# Altium integrated library Lib_MS_V4.0.IntLib: 296 symbols (part 1 of 2) (continued)
## Cap Cer_470pF_50V_X7R_0603 (continued)
CAP CER 470PF 50V X7R 0603; ComponentLink1Description: LKCL; ComponentLink1URL: https://linhkienchatluong.vn/tu-dan-0603/tu-dan-0603-471-470pf-047nf-50v-10-10c_sp1063_ct14367.aspx; ComponentLink2Description: DIGIKEY; ComponentLink2URL: https://www.digikey.com/en/products/detail/vishay-vitramon/VJ0603Y471KXACW1BC/420860?s=N4IgTCBcDaIAwDY4GYBCAWA7ARgNIFY44A5AFRAF0BfIA
footprint Cap_0603
pins: 1, 2

## Cap Cer_1800pF_50V_X7R_0603
designator C?, comment value 1800pF  Package: 0603  Voltage: 50V  (hidden comment: C0603C182K5RACTU)
1800 pF ±10% 50V Ceramic Capacitor X7R 0603 (1608 Metric); ComponentLink1Description: CXT; ComponentLink2Description: DIGIKEY; ComponentLink2URL: https://www.digikey.bg/en/products/detail/kemet/C0603C182K5RACTU/2200109
footprint Cap_0603
pins: 1, 2

## Cap Cer_2200pF_50V_X7R_0402
designator C?, comment value 2200pF  Package: 0402  Voltage: 50V  (hidden comment: GRM155R71H222KA01D)
CAP CER 2200PF 50V X7R 0402; ComponentLink1Description: CXT; ComponentLink1URL: https://linhkien.cxtvn.com/8769-tu-khong-phan-cuc-0402.html; ComponentLink2Description: DIGIKEY; ComponentLink2URL: https://www.digikey.bg/en/products/detail/murata-electronics/GRM155R71H222KA01D/587234?s=N4IgTCBcDaIOICUCyBGArGhB2FAJMBA0gIIAMKAIiALoC%2BQA
footprint Cap_0402
pins: 1, 2

## Cap Cer_3300pF_25V_X7R_0603
designator C?, comment value 3300pF  Package: 0603  Voltage: 25V  (hidden comment: KGM15AR71E332KT)
3300 pF ±10% 25V Ceramic Capacitor X7R 0603 (1608 Metric); ComponentLink2Description: DIGIKEY; ComponentLink2URL: https://www.digikey.bg/en/products/detail/kyocera-avx/KGM15AR71E332KT/1599455
footprint Cap_0603
pins: 1, 2

## Cap Cer_5600pF_50V_X7R_0603
designator C?, comment value 5600pF  Package: 0603  Voltage: 50V  (hidden comment: CL10B562KB8NNNC)
5600 pF ±10% 50V Ceramic Capacitor X7R 0603 (1608 Metric); ComponentLink1Description: CXT; ComponentLink2Description: DIGIKEY; ComponentLink2URL: https://www.digikey.bg/en/products/detail/samsung-electro-mechanics/CL10B562KB8NNNC/3887749
footprint Cap_0603
pins: 1, 2

## Cap tantalum_47uF_10V_3216
designator C?, comment 47uF  Package: 3216  Voltage: 10V
Cap tantalum 476A - 47uF 10V SMD3216; ComponentLink1Description: BLK; ComponentLink1URL: https://banlinhkien.com/tu-tantalum-476a47uf-10v-smd3216-p6650490.html; Value: 47uF
footprint Cap tantalum_3216
pins: 1, 2

## CON 2 15EDG3.81-2P Xanh Cong
designator J?, comment 284513-2  (value not drawn)
Terminal Block THT Right Angle 2-Position Header 3.81mm pitch; Manufacturer 1: Tyco Electronics; Pitch: 0.150" (3.81mm); Voltage: 300V; Category: Connectors; Mounting Type: Through Hole; Package / Case: Side Entry; 3.81mm pitch; Manufacturer Part Number 1: 284513-2; ComponentLink1Description: New link; ComponentLink1URL: https://banlinhkien.com/con-2-15edg3.812p-xanh-cong-p6649884.html
footprint CON 2 15EDG3.81-2P
pins: 1, 2

## CON 2 KF7.62-2P 7.62MM
designator J?  (value not drawn)
Current: 20A; Voltage: 300V; ComponentLink1Description: BLK; ComponentLink1URL: https://banlinhkien.com/con-2-kf7.622p-7.62mm-den-thang-p6649864.html; Size: 7.62mm; ComponentLink2Description: CXT; ComponentLink2URL: https://linhkien.cxtvn.com/8859-cau-dau-kf762-762mm.html
footprint CON 2 KF7.62-2P 7.62MM
pins: 1, 2

## CON 4 15EDG3.81-4P Xanh Cong
designator J?, comment 284513-4  (value not drawn)
Terminal Block THT Right Angle 4-Position Header 3.81mm pitch; Pitch: 0.150" (3.81mm); Voltage: 300V; Value: 4 position; Category: Connectors; Mounting Type: Through Hole; Terminal Block Type: Header, Male Pins, Right-angle, Shrouded (4 Side); Package / Case: Side Entry; 3.81mm pitch; Manufacturer Part Number 1: 284513-4; ComponentLink1Description: New link; ComponentLink1URL: https://banlinhkien.com/con-4-15edg3.814p-xanh-cong-p12117346.html
footprint CON 4 15EDG3.81-4P (TERM BLOCK HDR 4POS 3.81MM RIGHT-ANGLE)
pins: 1, 2, 3, 4

## CON 5 15EDG3.81-5P Xanh Cong
designator J?, comment 284513-5  (value not drawn)
Terminal Block THT Right Angle 5-Position Header 3.81mm pitch; Pitch: 0.150" (3.81mm); Voltage: 300V; Value: 5 position; Positions Per Level: 6; Category: Connectors; Mounting Type: Through Hole; Terminal Block Type: Header, Male Pins, Right-angle, Shrouded (4 Side); Package / Case: Side Entry; 3.81mm pitch; Manufacturer Part Number 1: 284513-5; ComponentLink1Description: New link; ComponentLink1URL: https://banlinhkien.com/con-4-15edg3.814p-xanh-cong-p12117346.html
footprint CON 5 15EDG3.81-5P (TERM BLOCK HDR 5POS 3.81MM RIGHT-ANGLE)
pins: 1, 2, 3, 4, 5

## CON 6 15EDG3.81-6P Xanh Cong
designator J?, comment 284513-6  (value not drawn)
Terminal Block THT Right Angle 6-Position Header 3.81mm pitch; Pitch: 0.150" (3.81mm); Voltage: 300V; Value: 6 position; Positions Per Level: 6; Category: Connectors; Mounting Type: Through Hole; Terminal Block Type: Header, Male Pins, Right-angle, Shrouded (4 Side); Package / Case: Side Entry; 3.81mm pitch; Manufacturer Part Number 1: 284513-6; ComponentLink1Description: Link_Digikey; ComponentLink1URL: https://www.digikey.com/en/products/detail/te-connectivity-amp-connectors/284513-6/1150189; ComponentLink2Description: CXT; ComponentLink2URL: https://linhkien.cxtvn.com/9006-cau-dau-15edg381-381mm-xanh-cong-mau-nhat.html
footprint CON 6 15EDG3.81-6P
pins: 1, 2, 3, 4, 5, 6 2

## CON 9 15EDG3.81-9P Xanh Cong
designator J?, comment 284513-9  (value not drawn)
Terminal Block THT Right Angle 9-Position Header 3.81mm pitch; Pitch: 0.150" (3.81mm); Voltage: 300V; Value: 9 position; Category: Connectors; Mounting Type: Through Hole; Terminal Block Type: Header, Male Pins, Right-angle, Shrouded (4 Side); Package / Case: Side Entry; 3.81mm pitch; Manufacturer Part Number 1: 284513-9; ComponentLink1Description: DIGIKEY; ComponentLink1URL: https://www.digikey.bg/en/products/detail/te-connectivity-amp-connectors/284513-9/1827406?s=N4IgTCBcDa4BwBYCsBGAzAWgJwgLoF8g; ComponentLink2Description: BLK; ComponentLink2URL: https://banlinhkien.com/con-9-15edg3.819p-xanh-cong-p12118760.html
footprint CON 9 15EDG3.81-9P
pins: 1, 2, 3, 4, 5, 6 2, 7 3, 8 4, 9 5

## CON_7798
designator J?, comment 7798
6 Pin Screw Terminal, Power Tap M4 Through Hole; Manufacturer: Keystone Electronics; Number Pin: 6; Description SEL: TERM SCREW M4 6 PIN PCB; Current Rating (Amps): 30A; Part Number: 7798; ComponentLink1Description: New link; ComponentLink1URL: https://www.digikey.com/en/products/detail/keystone-electronics/7798/2171014
footprint 7798
pins: 1, 2, 3, 4, 5, 6

## CON_XHB 2.5-6A
designator H?, comment XHB 2.5-6A
Manufacturer: Molex; Description SEL: Header 6P 2.5 chân thẳng có khóa; Part Number: XHB 2.5-6A; Footprint Type: TH; ComponentLink1Description: TGIC; ComponentLink1URL: https://www.thegioiic.com/dau-xhb-6a-2-54mm-6-chan-thang-xuyen-lo
footprint XHB-6A
pins: 1, 2, 3, 4, 5, 6

## CONN_HB9500_8P_9.5mm
designator CONN?, comment HB9500-8P
HB9500-8P 9.5mm; Part Number: HB9500; Voltage: 300V; Current: 30A; Number Pin: 8; Pitch: 9.5mm; ComponentLink1Description: LKCL; ComponentLink1URL: https://linhkienchatluong.vn/cau-dau-hb9500-co-nap/cau-dau-8p-hb9500-8p-95mm-co-nap-bao-ve_sp997_ct9544.aspx
footprint CONN_HB9500_9.5mm
pins: 1, 2, 3, 4, 5, 6, 7, 8

## CONN_JST_1.25mm_Vertical
designator CONN?
Position: 7; Pitch: 1.25mm; ComponentLink1Description: Aliexpress; ComponentLink1URL: https://vi.aliexpress.com/item/4000691087661.html?gatewayAdapt=glo2vnm; Category: Connector
footprint CONN_JST_1.25mm_7P
pins: 1, 2, 3, 4, 5, 6, 7

## CONN_SMA-J-P-H-ST-EM1
designator J?, comment SMA-J-P-H-ST-EM1
SMA Connector Jack, Female Socket 50 Ohms Board Edge, End Launch Solder; Manufacturer: SAMTEC; Impedance: 50 Ohms; Frequency - Max: 20 GHz; Manufacturer_Part_Number: SMA-J-P-H-ST-EM1; ComponentLink1Description: CXT; ComponentLink1URL: https://linhkien.cxtvn.com/1140-de-anten-sma-khd-cai-16mm-5-chan-thang-cao-135mm.html; ComponentLink2Description: DIGIKEY; ComponentLink2URL: https://www.digikey.com/en/products/detail/samtec-inc/SMA-J-P-H-ST-EM1/2602450
footprint CO_SAMTEC_SMA-J-P-ST-EMI
pins: 1 X, 2 Y

## DB9_Female
designator J?, comment LK_01108  (value not drawn)
Connector, DB9 R/A Through-hole Female; Number Pin: 9; ComponentLink1Description: BLK; ComponentLink1URL: https://banlinhkien.com/db9-cai-cong-p6653347.html; Sort: Female
footprint DB9_Female
pins: 1, 2, 3, 4, 5, 6, 7, 8, 9, 10 MH1, 11 MH2

## DB9_Male
designator J?, comment LK_01111  (value not drawn)
Connector, DB9 R/A Through-hole Male; Number Pin: 9; ComponentLink1Description: New link; ComponentLink1URL: https://banlinhkien.com/db9-duc-cong-p6653350.html; Sort: Male
footprint DB9
pins: 1, 2, 3, 4, 5, 6, 7, 8, 9, 10 MH1, 11 MH2

## Diode-Bridge_KBP307
designator DB?, comment KBP307
Cắm; Manufacturer: EVVO; Voltage: 700V; Current: 3A; Voltage - Forward: 1.1 V; Part Number: KBP307; Package: 4-SIP, KBP; ComponentLink1Description: BLK; ComponentLink1URL: https://banlinhkien.com/diode-cau-3a-700v-kbp307-vuong-p6653424.html; ComponentLink2Description: DIGIKEY; ComponentLink2URL: https://www.digikey.bg/en/products/detail/evvo/KBP307/26582989
footprint DIODE-BRIDGE_KBP307
pins: 1 +, 2 ~, 3 ~, 4 -

## Diode-ESD_ESD9B5.0ST5G
designator D?, comment Capacitance: 15pF  Voltage - Reverse: 5V  (hidden comment: ESD9B5.0ST5G)
TVS DIODE 5VWM SOD923; Voltage - Breakdown: 5.8; Sort: Bidirectional; ComponentLink1Description: New link; ComponentLink1URL: https://www.digikey.bg/en/products/detail/onsemi/ESD9B5-0ST5G/1646449; Package: SOD-923
footprint Diode_ESD_ESD9B5.0ST5G
pins: 1 A, 2 A1

## Diode-Schottky_1N4007
designator D?, comment 1N4007  Sort: Schottky  Current: 1A  Voltage: 1000V
DIODE SCHOTTKY 1000V 1A SOD123; Mouting type: SMD; ComponentLink1Description: BLK; ComponentLink1URL: https://banlinhkien.com/diode-t7-sod123-1n4007-sod123-10c-p16398844.html; Package: SOD-123; MSL: 1; ComponentLink2Description: DIGIKEY; ComponentLink2URL: https://www.digikey.bg/en/products/detail/smc-diode-solutions/1N4007FL/11657817
footprint DIODE_SCHOTTKY_SS14(1N5819)
pins: 1 A, 2 K

## Diode-Schottky_1N5819HW-7-F
designator D?, comment 1N5819HW-7-F  Sort: Schottky  Current: 1A  Voltage: 40V
Diode 40 V 1A Surface Mount SOD-123; Mouting type: SMD; ComponentLink1Description: BLK; ComponentLink1URL: https://banlinhkien.com/diode-s4-sod123-1n5819-sod123-10c-p16133952.html; Package: SOD-123; MSL: 1; ComponentLink2Description: DIGIKEY; ComponentLink2URL: https://www.digikey.com/en/products/detail/diodes-incorporated/1N5819HW-7-F/814970
footprint DIODE_SCHOTTKY_SS14(1N5819)
pins: 1 A, 2 K

## Diode-Schottky_BAS100CS-AU_R1_000A1
designator D?, comment BAS100CS-AU_R1_000A1  Sort: Schottky  Current: 500mA  Voltage: 100V
Diode 100 V 500mA Surface Mount SOD-323; Manufacturer: Panjit International Inc.; Description SEL: DIODE SCHOTTKY 100V 500MA SOD323; Part Number: BAS100CS-AU_R1_000A1; Footprint Type: SMD; ComponentLink1Description: DIGIKEY; ComponentLink1URL: https://www.digikey.com/en/products/detail/panjit-international-inc/BAS100CS-AU-R1-000A1/14660870; Package: SOD-123
footprint DIODE-SCHOTTKY_BAS100CS-AU_R1_000A1_SOD323
pins: 1 A, 2 K

## Diode-Schottky_BAT42WS-7-F
designator D?, comment BAT42WS-7-F  Sort: Schottky  Voltage: 30V  Current: 200mA
DIODE SCHOTTKY 30V 200MA SOD323; Manufacturer: Diodes Inc.; Part Number: BAT42WS-7-F; Footprint Type: SMD; Packaging: SOD-323; ComponentLink1Description: DIGIKEY; ComponentLink1URL: https://www.digikey.com/en/products/detail/diodes-incorporated/BAT42WS-7-F/806536
footprint DIODE_SCHOTTKY_BAT42WS-7-F
pins: 1 A, 2 K

## Diode-Schottky_BAT46W-7-F
designator D?, comment BAT46W-7-F  Sort: Schottky  Current: 150mA  Voltage: 100V
Diode 100 V 150mA Surface Mount SOD-123; Manufacturer: Diodes Incorporated; Part Number: BAT46W-7-F; Footprint Type: SMD; ComponentLink1Description: DIGIKEY; ComponentLink1URL: https://www.digikey.bg/en/products/detail/diodes-incorporated/BAT46W-7-F/1934440; Package: SOD123
footprint DIODE-SCHOTTKY_BAT46W-7-F
pins: 1 A, 2 K

## Diode-Schottky_CDBM1100-G
designator D?, comment CDBM1100-G  Sort: Schottky  Current: 1A  Voltage: 100V
DIODE SCHOTTK 100V 1A MINI SMA; Manufacturer: Comchip Technology; Description SEL: DIODE SCHOTTKY 100V 1A MINISMA; Part Number: CDBM1100-G; ComponentLink1Description: DIGIKEY; ComponentLink1URL: https://www.digikey.com/en/products/detail/comchip-technology/CDBM1100-G/2021250?s=N4IgTCBcDaIMIBEBCBZAjGgDJgtAcRAF0BfIA; Package: SOD-123
footprint DIODE-SCHOTTKY_CDBM1100-G
pins: 1 A, 2 K

## Diode-Schottky_SBA340AL_R1_00001
designator D?, comment Sort: Schottky  Current: 3A  Voltage: 40V  (hidden comment: SBA340AL_R1_00001)
DIODE SCHOTTKY 40V 3A SOD123FL; ComponentLink1Description: New link; ComponentLink1URL: https://www.digikey.bg/en/products/detail/panjit-international-inc/SBA340AL-R1-00001/14660768; Part Number: SBA340AL_R1_00001; Package: SOD-123FL
footprint Diode_Schottky_SOD-123FL
pins: 1 A, 2 K

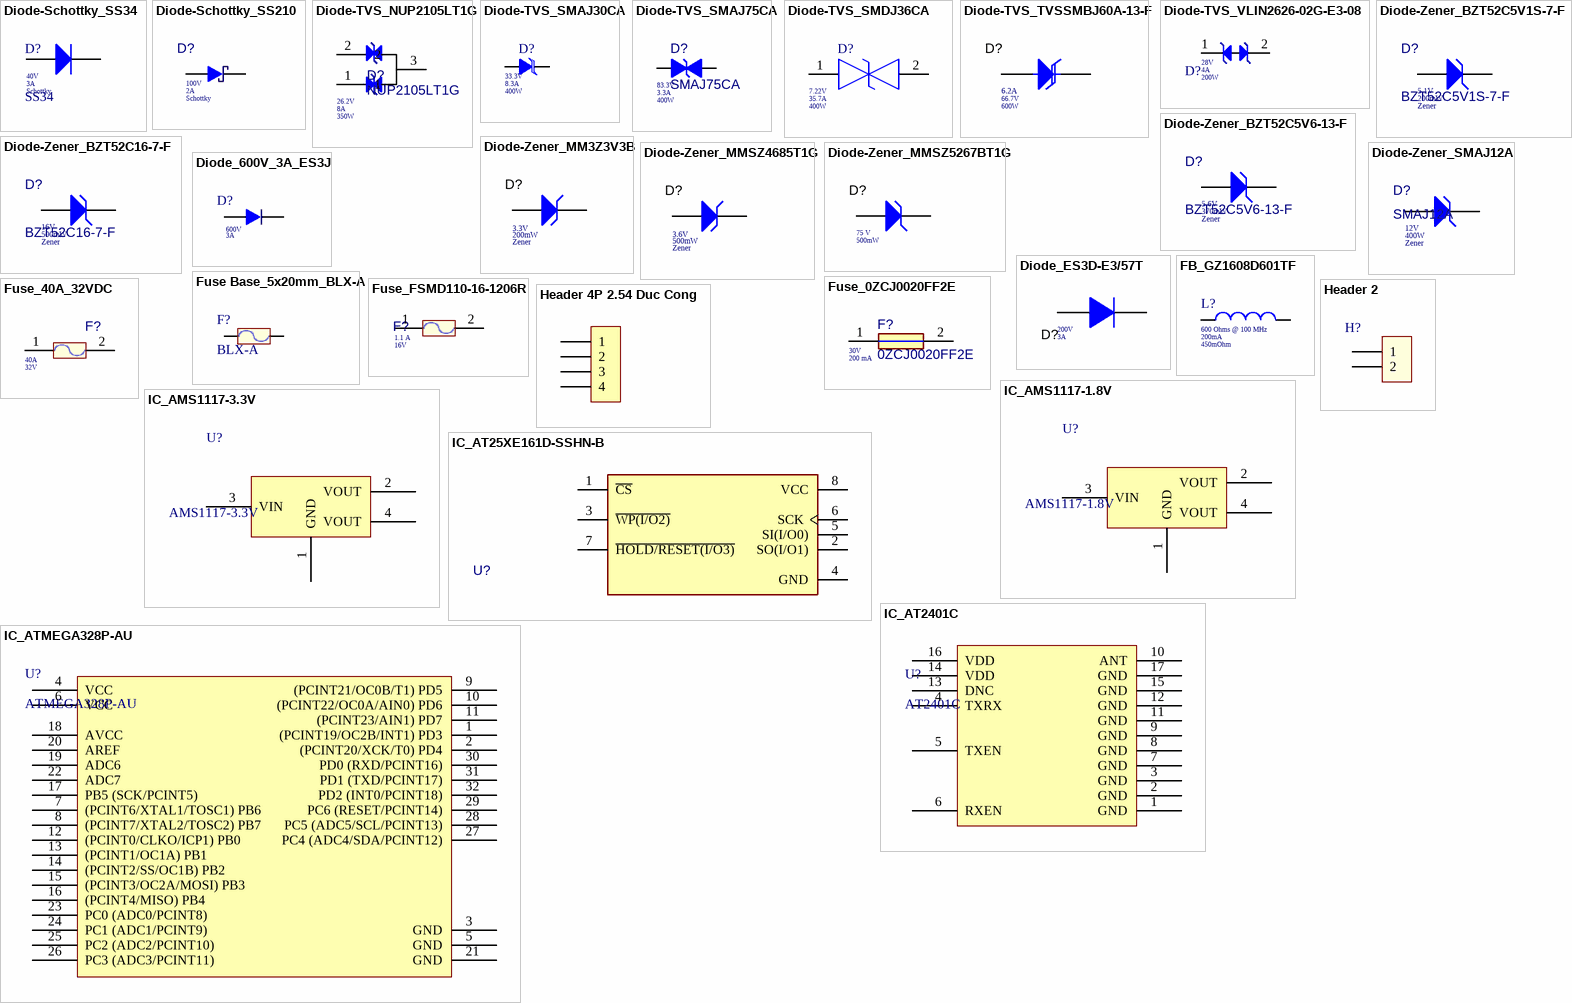
[diagram p2: symbols Diode-Schottky_SS34 to IC_ATMEGA328P-AU]

## Diode-Schottky_SS34
designator D?, comment SS34  Sort: Schottky  Current: 3A  Voltage: 40V
DIODE SCHOTTKY 40V 3A DO214AC; Manufacturer: Diode SS34 3A 40V SMA ( 1N5822 SS34A); ComponentLink1Description: New link; ComponentLink1URL: https://banlinhkien.com/diode-ss34-3a-40v-sma-1n5822-ss34a-p6652165.html; Part Number: SS34; Package: DO-214AC (SMA)
footprint DIODE_SS34_1N5822 (SMA)
footprint DIODE_SS34_DO-214AB
pins: 1 A, 2 K

## Diode-Schottky_SS210
designator D?, comment Sort: Schottky  Current: 2A  Voltage: 100V  (hidden comment: SS210)
Diode 100 V 2A Surface Mount DO-214AA (SMB); Manufacturer: TAIWAN SEMICONDUCTOR; Description SEL: DIODE SCHOTTKY 100V 2A DO214AA; Part Number: SS210; Footprint Type: SMD; ComponentLink1Description: TGIC; ComponentLink1URL: https://www.thegioiic.com/ss210-sma-diode-schottky-2a-100v; ComponentLink2Description: DIGIKEY; ComponentLink2URL: https://www.digikey.bg/en/products/detail/taiwan-semiconductor-corporation/SS210/7369371
footprint DIODE-SCHOTTKY_SS210_DO214 (DO214)
pins: 1 A, 2 K

## Diode-TVS_NUP2105LT1G
designator D?, comment NUP2105LT1G  Current - Peak Pulse: 8A  Power: 350W  Voltage - Breakdown: 26.2V
44V Clamp 8A (8/20µs) Ipp Tvs Diode Surface Mount SOT-23-3 (TO-236); Manufacturer: onsemi; Description SEL: TVS DIODE 24VWM 41VC SOT23; Sort: BIDIRECTIONAL; Voltage - Reverse: 24V; Part Number: NUP2105LT1G; Footprint Type: SMD; ComponentLink1Description: DIGIKEY; ComponentLink1URL: https://www.digikey.bg/en/products/detail/onsemi/NUP2105LT1G/1749081; Voltage - Clamping: 44V
footprint DIODE-TVS_NUP2105LT1G_SOT233
pins: 1, 2, 3

## Diode-TVS_SMAJ30CA
designator D?, comment Current: 8.3A  Voltage - Breakdown: 33.3V  Power: 400W  (hidden comment: SMAJ30CA)
TVS DIODE 30VWM 48.4VC DO214AC; Manufacturer: Littelfuse; Voltage - Clamping (Vcl): 48.4V; Polarity: Unidirectional; Voltage - Reverse Standoff (Vrwm): 30V; Diode Type: TVS Diode; Mounting Type: Surface Mount (SMD); Manufacturer Part Number: SMAJ30CA; ComponentLink1Description: CXT; ComponentLink1URL: https://linhkien.cxtvn.com/6001-smaj30ca-tvs-diode-30v-83a-smado-214ac.html; ComponentLink2Description: DIGIKEY; ComponentLink2URL: https://www.digikey.gr/en/products/detail/littelfuse-inc/SMAJ30CA/762295; Package: DO-214AC (SMA)
footprint DO214AC-SMA
pins: 1 C, 2 A

## Diode-TVS_SMAJ75CA
designator D?, comment SMAJ75CA  Current - Peak Pulse: 3.3A  Power - Peak Pulse: 400W  Voltage-Breakdown: 83.3V
121V Clamp 3.3A Ipp Tvs Diode Surface Mount DO-214AC (SMA); Description SEL: TVS DIODE 75VWM 121VC; Voltage-Reverse: 75V; Sort: Bidirectional; Part Number: SMAJ75CA; ComponentLink1Description: DIGIKEY; ComponentLink1URL: https://www.digikey.com/en/products/detail/bourns-inc/SMAJ75CA/2254545; Voltage - Clamping (Max): 121V; Package: DO214AC
footprint DIODE-TVS_DO-214AC_SMAJ75CA
pins: 1 A, 2 K

## Diode-TVS_SMDJ36CA
designator D?, comment Power - Peak Pulse: 400W  Current - Peak Pulse: 35.7A  Voltage - Breakdown (Min): 7.22V  (hidden comment: SMAJ6.5CA)
11.2V Clamp 35.7A Ipp Tvs Diode Surface Mount DO-214AC (SMA); Description SEL: TVS DIODE 6.5VWM 11.2VC DO214AC; Voltage - Reverse: 6.5V; Sort: Bidirectional; Part Number: SMAJ6.5CA; ComponentLink1Description: New link; ComponentLink1URL: https://www.digikey.com/en/products/detail/littelfuse-inc/SMAJ6-5CA/762255; Voltage - Clamping (Max): 11.2V; Package: DO-214AC, SMA
footprint DO-214AC
pins: 1, 2

## Diode-TVS_TVSSMBJ60A-13-F
designator D?, comment Power - Peak Pulse: 600W  Voltage - Breakdown (Min): 66.7V  Current - Peak Pulse: 6.2A  (hidden comment: SMBJ60A-13-F)
96.8V Clamp 6.2A Ipp Tvs Diode Surface Mount SMB; Manufacturer: Diodes Inc.; Description SEL: TVS DIODE 60VWM 96.8VC SMB; Voltage - Reverse: 60V; Part Number: SMBJ60A; ComponentLink1Description: DIGIKEY; ComponentLink1URL: https://www.digikey.bg/en/products/detail/diodes-incorporated/SMBJ60A-13-F/814633?s=N4IgTCBcDaIMoFkBCApAbABgIIFoCMAzDgGIgC6AvkA; Voltage - Clamping (Max): 96.8V
footprint DIODE-TVS_SMBJ60A-13-F
pins: 1 A, 2 K

## Diode-TVS_VLIN2626-02G-E3-08
designator D?, comment Current - Peak Pulse: 4A  Power - Peak Pulse: 200W  Voltage - Breakdown (Min): 28V  (hidden comment: VLIN2626-02G-E3-08)
50V Clamp 4A (8/20µs) Ipp Tvs Diode Surface Mount SOD-323; Manufacturer: Vishay; Description SEL: TVS DIODE 26.5VWM 50VC SOD323; Voltage - Reverse: 26.5V (Max); Part Number: VLIN2626-02G-E3-08; Voltage - Clamping (Max): 50V; ComponentLink1Description: DIGIKEY; ComponentLink1URL: https://www.digikey.com/en/products/detail/vishay-general-semiconductor-diodes-division/VLIN2626-02G-E3-08/6021436?s=N4IgTCBcDaIGoBkCSA5MA2DBaADGA4lgKIDMuAHCALoC%2BQA; Package: SOD-323
footprint DIODE-TVS_26.5V_4A_VLIN2626-02G-E3-08
pins: 1, 2

## Diode-Zener_BZT52C5V1S-7-F
designator D?, comment BZT52C5V1S-7-F  Type: Zener  Voltage: 5.1V  Power: 200mW
Zener Diode 5.1 V 200 mW ±6% Surface Mount SOD-323; Manufacturer: Diodes Incorporated; Part Number: BZT52C5V1S-7-F; Footprint Type: SMD; ComponentLink1Description: DIGIKEY; ComponentLink1URL: https://www.digikey.bg/en/products/detail/diodes-incorporated/BZT52C5V1S-7-F/717737; Package: SOD-123
footprint DIODE-ZENER_BZT52C5V1S-7-F_SOD323
pins: 1 A, 2 K

## Diode-Zener_BZT52C5V6-13-F
designator D?, comment BZT52C5V6-13-F  Type: Zener  Voltage: 5.6V  Power: 370mW
DIODE ZENER 5.6V 370MW SOD123; Manufacturer: Diodes Incorporated; Part Number: BZT52C5V6-13-F; Footprint Type: SMD; Description SEL: DIODE ZENER 5.6V 370MW SOD123; ComponentLink1Description: DIGIKEY; ComponentLink1URL: https://www.digikey.com/en/products/detail/diodes-incorporated/BZT52C5V6-13-F/1534399?s=N4IgTCBcDaIEIC0AqBWMBhFA1AbAWgEYBmPAMRAF0BfIA; Package: SOD123
footprint DIODE-ZENER_BZT52C5V6-13-F
pins: 1 A, 2 K

## Diode-Zener_BZT52C16-7-F
designator D?, comment BZT52C16-7-F  Type: Zener  Voltage: 16V  Power: 500mW
Zener Diode 16 V 500 mW ±6% Surface Mount SOD-123; Manufacturer: Diodes Incorporated; Description SEL: DIODE ZENER 16V 500MW SOD123; Part Number: BZT52C16-7-F; Footprint Type: SMD; ComponentLink1Description: DIGIKEY; ComponentLink1URL: https://www.digikey.com/en/products/detail/diodes-incorporated/BZT52C16-7-F/717729?s=N4IgTCBcDaIEIC0AqBWMBhAjANgLQHZcAxEAXQF8g; Package: SOD-123
footprint DIODE-ZENER_16V_500mW_BZT52C16-7-F
pins: 1 A, 2 K

## Diode-Zener_MM3Z3V3B
designator D?, comment Type: Zener  Power: 200mW  Voltage: 3.3V  (hidden comment: MM3Z3V3B)
Zener Diode 3.3 V 200 mW ±2% Surface Mount SOD-323F; Manufacturer: ON Semiconductor; Part Number: MM3Z3V3B; ComponentLink1Description: DIGIKEY; ComponentLink1URL: https://www.digikey.com/en/products/detail/onsemi/MM3Z3V3B/1626765?s=N4IgTCBcDaILJwMwC1EDVECEAqAlAtAHIAiIAugL5A; Package: SOD-323F; Operating Temperature: -65°C ~ 150°C; MSL: 1
footprint DIODE-ZENER_SOD-323FL_MM3Z3V3B
pins: 1 A, 2 K

## Diode-Zener_MMSZ4685T1G
designator D?, comment Type: Zener  Power: 500mW  Voltage: 3.6V  (hidden comment: MMSZ4685T1G)
Zener Diode 3.6 V 500 mW ±5% Surface Mount SOD-123; Manufacturer: ON Semiconductor; Part Number: BZT52C3V6-7-F; Description SEL: DIODE ZENER 3.6V 500MW SOD123; ComponentLink1Description: DIGIKEY; ComponentLink1URL: https://www.digikey.com/en/products/detail/onsemi/MMSZ4685T1G/919719; Package: SOD-123
footprint DIODE-ZENER_3.6V_500mW_MMSZ4685T1G
pins: 1 A, 2 K

## Diode-Zener_MMSZ5267BT1G
designator D?, comment Power: 500mW  Voltage: 75 V  (hidden comment: MMSZ5267BT1G)
Diode, Zener, 75V, 500 mW, AEC-Q101, SOD-123; Manufacturer: ONSEMI; Description SEL: DIODE ZENER 75V 500MW SOD123; Part Number: MMSZ5267BT1G; Footprint Type: SMD; Package: SOD-123; ComponentLink1Description: DIGIKEY; ComponentLink1URL: https://www.digikey.bg/en/products/detail/onsemi/MMSZ5267BT1G/1749051
footprint DIODE-ZENER_MMSZ5267BT1G_SOD123
pins: 1 A, 2 K

## Diode-Zener_SMAJ12A
designator D?, comment SMAJ12A  Voltage: 12V  Power: 400W  Type: Zener
19.9V Clamp 20.1A Ipp Tvs Diode Surface Mount DO-214AC (SMA); Manufacturer: MDD; Description SEL: TVS DIODE 12VWM 19.9VC DO214AC; Footprint Type: SMD; ComponentLink1Description: TGIC; ComponentLink1URL: https://www.thegioiic.com/smaj12a; ComponentLink2Description: DIGIKEY; ComponentLink2URL: https://www.digikey.bg/en/products/detail/littelfuse-inc/SMAJ12A/762270; Package: DO-214AC
footprint DIODE-ZENER_SMAJ12A_DO-214AC
pins: 1 A, 2 K

## Diode_600V_3A_ES3J
designator D?, comment Current: 3A  Voltage: 600V  (hidden comment: ES3J)
Diode 600 V 3A Surface Mount DO-214AB (SMC); ComponentLink1Description: TGIC; ComponentLink1URL: https://www.thegioiic.com/es3j-smc-diode-chinh-luu-3a-600v?gidzl=aC7rEZVjhncHsVSrDlQc79JQ-30fzlDFsDsiP7_s_KYAt_Sr8QQc6z7Q_p0ZzgSSWut_FsMJ6caRD-kg6G; ComponentLink2Description: DIGIKEY; ComponentLink2URL: https://www.digikey.com/en/products/detail/onsemi/ES3J/1087635
footprint Diode_600V_3A_ES3J
pins: 1 A, 2 K

## Diode_ES3D-E3/57T
designator D?, comment Voltage: 200V  Current: 3A  (hidden comment: ES3D-E3/57T)
Diode 200 V 3A Surface Mount DO-214AB (SMC); Manufacturer: Vishay-Semiconductor; Description SEL: DIODE GEN PURP 200V 3A DO214AB; Part Number: ES3D-E3/57T; Footprint Type: SMD; ComponentLink1Description: DIGIKEY; ComponentLink1URL: https://www.digikey.bg/en/products/detail/vishay-general-semiconductor-diodes-division/ES3D-E3-57T/1091448?s=N4IgTCBcDaIKIGUDMARAtHJB6ArAdgBUQBdAXyA; Package: DO-214AB (SMC)
footprint DIODE_ES3D-E3/57T_DO214AB
pins: 1 A, 2 K

## FB_GZ1608D601TF
designator L?, comment DC Resistance: 450mOhm  Current Rating (Max): 200mA  Impedance @ Frequency: 600 Ohms @ 100 MHz  (hidden comment: GZ1608D601TF)
600Ω @ 100MHz 1 200mA 450mΩ 0603 Ferrite Beads ROHS; Manufacturer: Sunlord; Manufacturer Part Number: GZ1608D601TF; LCSC Part Number: C1002; Package: 0603; Assembly Type: SMT Assembly; ComponentLink1Description: New link; ComponentLink1URL: https://www.digikey.com/en/products/detail/shenzhen-sunlord-electronics-co-ltd/GZ1608D601TF/14120345?s=N4IgTCBcDaIOIC0CMA2ADADgCLqQFQDEQBdAXyA
footprint FB_GZ1608D601TF
pins: 1, 2

## Fuse Base_5x20mm_BLX-A
designator F?, comment BLX-A
5x20mm; Part Number: BLX-A; Dimension: 5x20mm; ComponentLink1Description: BLK; ComponentLink1URL: https://banlinhkien.com/de-cau-chi-blxa-5x20mm-5-chiec-p22613696.html
footprint De Cau Chi BLX-A 520 (PCB - Clip Cover - THR)
pins: 1, 2

## Fuse_0ZCJ0020FF2E
designator F?, comment 0ZCJ0020FF2E  Current - Hold (Ih) (Max): 200 mA  Voltage - Max: 30V
Polymeric PTC Resettable Fuse 30V 200 mA Ih Surface Mount 1206 (3216 Metric), Concave; Manufacturer: Bel Circuit Protection; Description SEL: PTC RESET FUSE 30V 200MA 1206; Current - Trip (It): 400 mA; Current - Max: 10 A; Part Number: 0ZCJ0020FF2E; Size: 1206; ComponentLink1Description: TGIC; ComponentLink1URL: https://www.thegioiic.com/0zcj0020ff2e-cau-chi-tu-phuc-hoi-1206-30v-200ma; ComponentLink2Description: DIGIKEY; ComponentLink2URL: https://www.digikey.com/en/products/detail/bel-fuse-inc/0ZCJ0020FF2E/4156326; Sort: PTC RESET
footprint FUSE_0ZCJ0020FF2E
pins: 1, 2

## Fuse_40A_32VDC
designator F?, comment Voltage Rating - DC: 32V  Current Rating (Amps): 40A  (hidden comment: 0287030.PXCN)
40 A AC 32 V DC Fuse Automotive Requires Holder Blade, ATO/ATC; Manufacturer: LITTELFUSE; Part Number: 0287040.PXCN; Description SEL: FUSE AUTOMOTIVE 40A 32VDC BLADE; Sort: AUTO; Footprint Type: TH; ComponentLink1Description: LKCL; ComponentLink1URL: https://linhkienchatluong.vn/cau-chi-dep-o-to-xe-may/cau-chi-dep-40a-32v-chan-nho-cho-o-to-xe-may_sp996_ct14638.aspx; ComponentLink2Description: DIGIKEY; ComponentLink2URL: https://www.digikey.bg/en/products/detail/littelfuse-inc/0287040-PXCN/2519817?s=N4IgTCBcDaIAxgBwHY4BY4DoAKANAwgHIgC6AvkA; Package: 0.752" L x 0.201" W x 0.484" H (19.10mm x 5.10mm x 12.30mm)
footprint FUSE_TH_30A
pins: 1, 2

## Fuse_FSMD110-16-1206R
designator F?, comment Voltage - Max: 16V  Current - Hold (Ih) (Max): 1.1 A  (hidden comment: FSMD110-16-1206R)
RESETTABLE FUSE - SMD, 1206 SIZE; Current - Trip (It): 2.2 A; Current - Max: 100 A; Description SEL: RESETTABLE FUSE - SMD, 1206 SIZE; Part Number: FSMD110-16-1206R; ComponentLink1Description: New link; Sort: RESETTABLE; Package: 1206
footprint FUSE_1206
pins: 1, 2

## Header 2
designator H?
Header 2 (Green); Voltage: 300V; Current: 15A; Pitch: 5.08mm; ComponentLink1Description: BLK; ComponentLink1URL: https://banlinhkien.com/con-2-2edg5.082p-5.08mm-xanh-cong-p6651835.html
footprint Header2T
pins: 1, 2

## Header 4P 2.54 Duc Cong
designator H?  (value not drawn)
Header 4P XH2.54-4P Đực Cong; Pitch: 2.54mm; Number Pin: 4; ComponentLink1Description: BLK; ComponentLink1URL: https://banlinhkien.com/header-4p-xh2.544p-duc-cong-10-chiec-p22290874.html
footprint Header 4P 2.54 Duc Cong
pins: 1, 2, 3, 4

## IC_AMS1117-1.8V
designator U?, comment AMS1117-1.8V
Linear Voltage Regulator IC Positive Fixed 1 Output 1A SOT-223-3L; Vout: 1.8V; Vin Max: 18V; ComponentLink1Description: BLK; ComponentLink1URL: https://banlinhkien.com/ams11171.8v-sot223-p6651250.html; Current Max: 1A; Package: SOT-223; Sort: SOT-223
footprint SOT223
pins: 1 GND, 2 VOUT, 3 VIN, 4 VOUT

## IC_AMS1117-3.3V
designator U?, comment AMS1117-3.3V
Linear Voltage Regulator IC Positive Fixed 1 Output 1A SOT-223-3L; Vin Max: 15V; Vout: 3.3; Sort: LDO; ComponentLink1Description: BLK; ComponentLink1URL: https://banlinhkien.com/ams11173.3v-sot223-p6651251.html; Current Max: 1A; Package: SOT-223
footprint SOT223
pins: 1 GND, 2 VOUT, 3 VIN, 4 VOUT

## IC_AT25XE161D-SSHN-B
designator U?, comment AT25XE161D-SSHN-B  (value not drawn)
NOR Flash 16 Mbit, Wide Vcc (1.65V to 3.6V); Manufacturer: Renesas Electronics Corporation; Description SEL: IC FLASH 16MBIT SPI/QUAD 8SOIC; Cross Component: W25Q80DVSSIG; Part Number: AT25XE161D-SSHN-B; ComponentLink1Description: DIGIKEY; ComponentLink1URL: https://www.digikey.bg/en/products/detail/renesas-electronics-corporation/AT25XE161D-SSHN-B/18717039; Sort: FLASH
footprint IC_AT25XE161D-SSHN-B
pins: 1 ~{CS}, 2 SO(I/O1), 3 ~{WP(I/O2)}, 4 GND, 5 SI(I/O0), 6 SCK, 7 ~{HOLD/RESET(I/O3)}, 8 VCC

## IC_AT2401C
designator U?, comment AT2401C
ZigBee 2V~3.6V QFN-16-EP(3x3) RF Front End Circuits ROHS; Sort: RF and Wireless; ComponentLink1Description: Aliexpress; ComponentLink1URL: https://vi.aliexpress.com/i/1005004853615083.html?gatewayAdapt=glo2vnm; Package: QFN-16-EP(3x3); ComponentLink2Description: LCSC; ComponentLink2URL: https://www.lcsc.com/product-detail/RF-Front-End-Circuits_ZHONGKEWEI-AT2401C_C783588.html
footprint IC_AT2401C
pins: 1 GND, 2 GND, 3 GND, 4 TXRX, 5 TXEN, 6 RXEN, 7 GND, 8 GND, 9 GND, 10 ANT, 11 GND, 12 GND, 13 DNC, 14 VDD, 15 GND, 16 VDD, 17 GND

## IC_ATMEGA328P-AU
designator U?, comment ATMEGA328P-AU
AVR AVR® ATmega Microcontroller IC 8-Bit 20MHz 32KB (16K x 16) FLASH 32-TQFP (7x7); Sort: MCU; ComponentLink1Description: New link; ComponentLink1URL: https://banlinhkien.com/atmega328pau-tqfp32-p6653725.html; Package: 32-TQFP
footprint IC_ATMEGA328P-AU
pins: 1 (PCINT19/OC2B/INT1) PD3, 2 (PCINT20/XCK/T0) PD4, 3 GND, 4 VCC, 5 GND, 6 VCC, 7 (PCINT6/XTAL1/TOSC1) PB6, 8 (PCINT7/XTAL2/TOSC2) PB7, 9 (PCINT21/OC0B/T1) PD5, 10 (PCINT22/OC0A/AIN0) PD6, 11 (PCINT23/AIN1) PD7, 12 (PCINT0/CLKO/ICP1) PB0, 13 (PCINT1/OC1A) PB1, 14 (PCINT2/SS/OC1B) PB2, 15 (PCINT3/OC2A/MOSI) PB3, 16 (PCINT4/MISO) PB4, 17 PB5 (SCK/PCINT5), 18 AVCC, 19 ADC6, 20 AREF, 21 GND, 22 ADC7, 23 PC0 (ADC0/PCINT8), 24 PC1 (ADC1/PCINT9), 25 PC2 (ADC2/PCINT10), 26 PC3 (ADC3/PCINT11), 27 PC4 (ADC4/SDA/PCINT12), 28 PC5 (ADC5/SCL/PCINT13), 29 PC6 (RESET/PCINT14), 30 PD0 (RXD/PCINT16), 31 PD1 (TXD/PCINT17), 32 PD2 (INT0/PCINT18)
